# Altium footprint library PCB_Footprints.PcbLib: 303 footprints (part 17 of 19)
Each footprint in its own frame and in the unit in brackets; x right, y up, seen from the top. Pads: shape width x height; smd on the part's side, far side on the other; paste and mask are expansions set on the pad; w line width, h text height; cw(c..) or ccw(c..) is an arc to the next point about the centre after c.
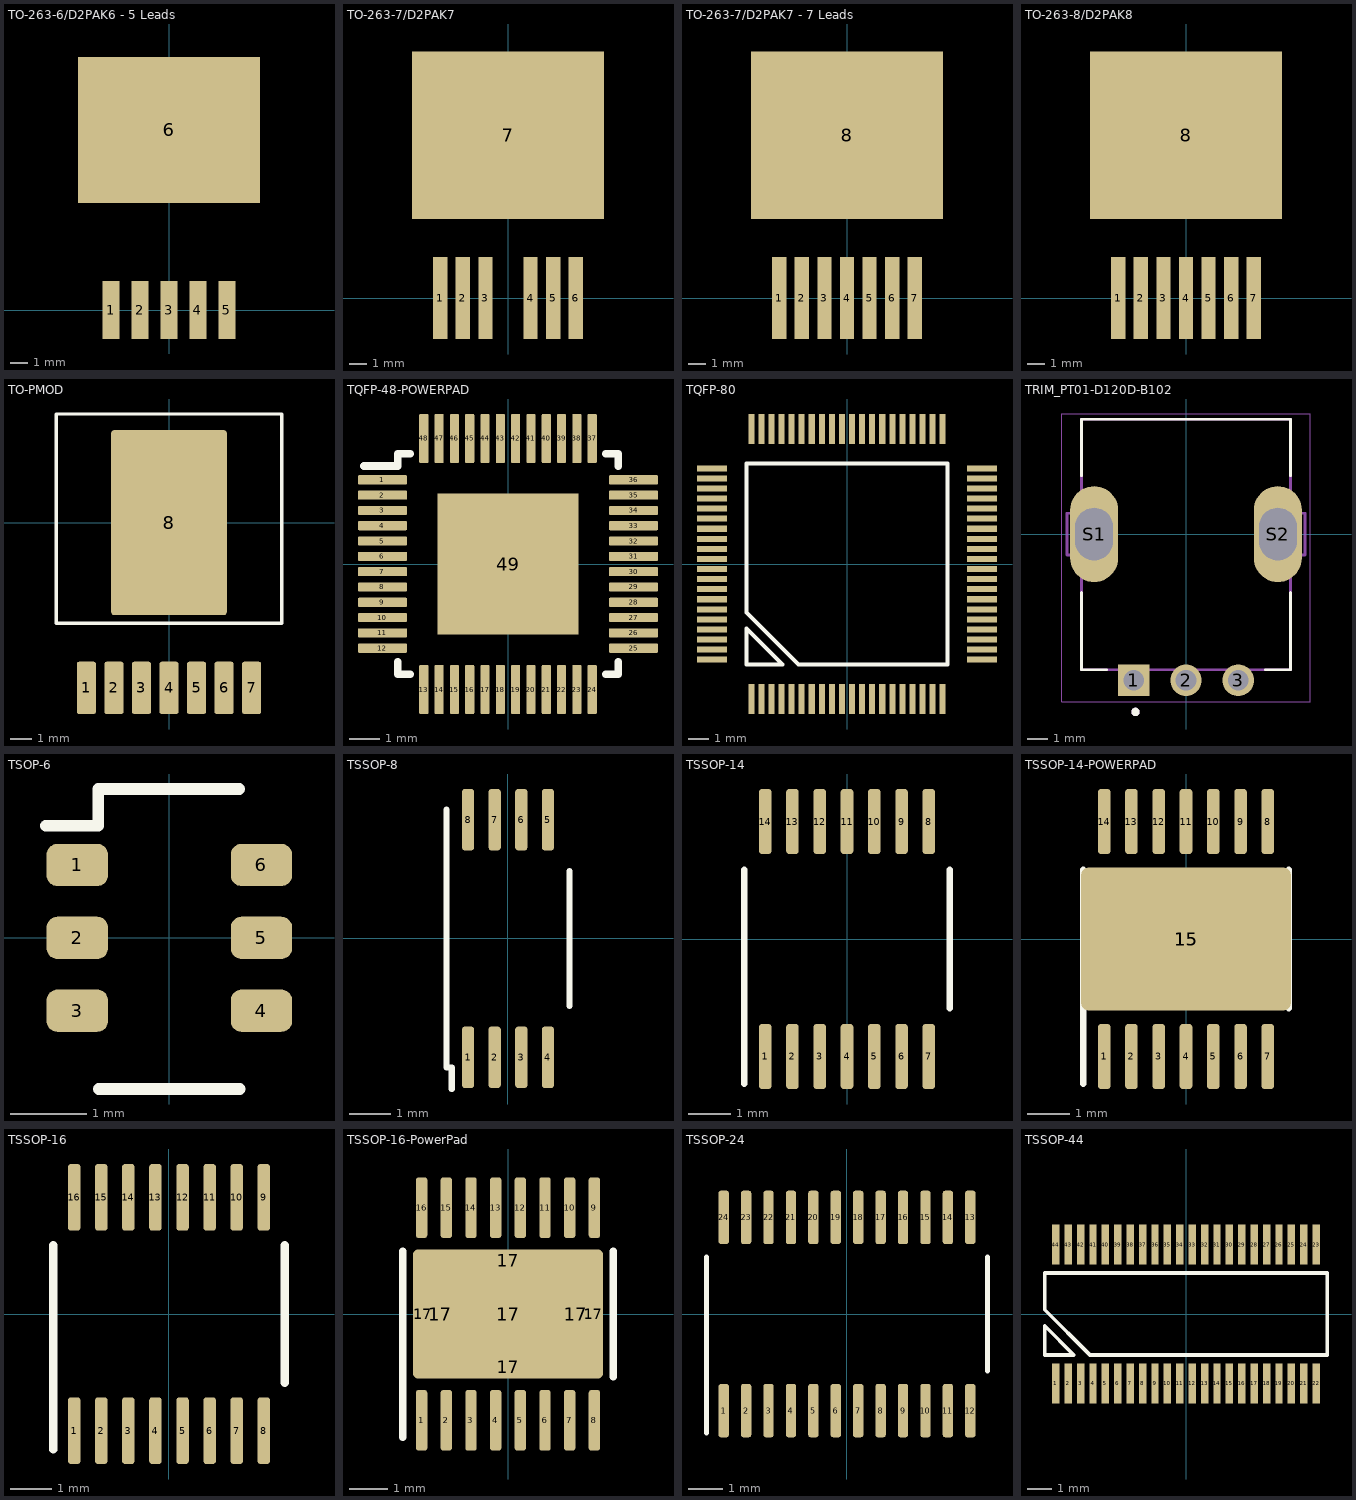
[diagram p16: the footprints below, top view; thin cyan lines are the x and y axes]

## TO-263-6/D2PAK6 - 5 Leads [mm] "TO-263-6, D²Pak (5 Leads + Tab), Modified from TO-263-7. From Texas Instruments  TL2575HV-05QKTTRQ1"
height 4.83
pads (6):
  rect 1x3.4 smd: 1(-3.4,0) 2(-1.7,0) 3(0,0) 4(1.7,0) 5(3.4,0)
  rect 10.7x8.6 smd: 6(0,10.6)
3D body "TL2575HV-05QKTTRQ1.STEP": height 4.65, standoff -0.03, extent -4.34,-1.11 4.3,14.76

## TO-263-7/D2PAK7 [mm] "TO-263-7, D²Pak (6 Leads + Tab), TO-263CB. From Infineon FLG09089"
height 4.83
pads (7):
  rect 0.8x4.6 smd: 1(-3.81,0) 2(-2.54,0) 3(-1.27,0) 4(1.27,0) 5(2.54,0) 6(3.81,0)
  rect 10.8x9.4 smd: 7(0,9.15)
3D body "SW3dPS-TO263-7S.STEP": height 4.8, standoff 0, extent -5,-2.125 5,13.545

## TO-263-7/D2PAK7 - 7 Leads [mm] "TO-263-7, D²Pak (7 Leads + Tab), Modified from TO-263CB. From Infineon FLG09089"
height 4.83
pads (8):
  rect 0.8x4.6 smd: 1(-3.81,0) 2(-2.54,0) 3(-1.27,0) 4(0,0) 5(1.27,0) 6(2.54,0) 7(3.81,0)
  rect 10.8x9.4 smd: 8(0,9.15)
3D body "SW3dPS-TO263-7S.STEP": height 4.8, standoff 0, extent -5,-2.125 5,13.545

## TO-263-8/D2PAK8 [mm] "TO-263-8, D²Pak (7 Leads + Tab), TO-263CA. modified from Infineon FLG09089"
height 4.572
pads (8):
  rect 0.8x4.6 smd: 1(-3.81,0) 2(-2.54,0) 3(-1.27,0) 4(0,0) 5(1.27,0) 6(2.54,0) 7(3.81,0)
  rect 10.8x9.4 smd: 8(0,9.15)
3D body "SW3dPS-TO263-7-1.STEP": height 4.81, standoff 0.01, extent -5,-2.05 5,13.62

## TO-PMOD [mil] "Based on WebBench design download."
pads (8):
  rrect25% 35x95 smd: 1(-150,-300) 2(-100,-300) 3(-50,-300) 4(0,-300) 5(50,-300) 6(100,-300) 7(150,-300)
  rrect5% 210x336 smd: 8(0,0)
Top Overlay:
  lines w6: -204.5,-182.75 -204.5,197.25 204.5,197.25 204.5,-182.75 -204.5,-182.75
3D body "NDW0007A.-TO-PMODstp.stp": height 188.3, standoff 0.5, extent -200.2,-341.93 199.8,200.2

## TQFP-48-POWERPAD [mm] "TQFP, 48-Leads, Body 7.00x7.00mm, Pitch 0.50mm, Thermal Pad 5.2x5.2mm from DRV8343Q1 rev Apr19 / 4146927/B 08/03"
height 1.2
pads (49):
  rrect25% 1.6x0.3 smd: 1(-4.1,2.75) 2(-4.1,2.25) 3(-4.1,1.75) 4(-4.1,1.25) 5(-4.1,0.75) 6(-4.1,0.25) 7(-4.1,-0.25) 8(-4.1,-0.75) 9(-4.1,-1.25) 10(-4.1,-1.75) 11(-4.1,-2.25) 12(-4.1,-2.75) 25(4.1,-2.75) 26(4.1,-2.25) 27(4.1,-1.75) 28(4.1,-1.25) 29(4.1,-0.75) 30(4.1,-0.25) 31(4.1,0.25) 32(4.1,0.75) 33(4.1,1.25) 34(4.1,1.75) 35(4.1,2.25) 36(4.1,2.75)
  rrect25% 0.3x1.6 smd: 13(-2.75,-4.1) 14(-2.25,-4.1) 15(-1.75,-4.1) 16(-1.25,-4.1) 17(-0.75,-4.1) 18(-0.25,-4.1) 19(0.25,-4.1) 20(0.75,-4.1) 21(1.25,-4.1) 22(1.75,-4.1) 23(2.25,-4.1) 24(2.75,-4.1) 37(2.75,4.1) 38(2.25,4.1) 39(1.75,4.1) 40(1.25,4.1) 41(0.75,4.1) 42(0.25,4.1) 43(-0.25,4.1) 44(-0.75,4.1) 45(-1.25,4.1) 46(-1.75,4.1) 47(-2.25,4.1) 48(-2.75,4.1)
  rect 4.6x4.6 smd: 49(0,0)
Top Overlay:
  lines w0.254: -4.7,3.2 -3.6,3.2 -3.6,3.6 -3.2,3.6 ; -3.6,-3.2 -3.6,-3.6 -3.2,-3.6 ; 3.2,-3.6 3.6,-3.6 3.6,-3.2 ; 3.2,3.6 3.6,3.6 3.6,3.2
3D body: height 1.2, standoff 0, extent -3.6,-3.6 3.6,3.6

## TQFP-80 [mm] "Thin Quad Flat Package. From Microchip DS00049AR"
height 1.2
pads (80):
  rect 0.3x1.5 smd: 1(-4.75,-6.7) 2(-4.25,-6.7) 3(-3.75,-6.7) 4(-3.25,-6.7) 5(-2.75,-6.7) 6(-2.25,-6.7) 7(-1.75,-6.7) 8(-1.25,-6.7) 9(-0.75,-6.7) 10(-0.25,-6.7) 11(0.25,-6.7) 12(0.75,-6.7) 13(1.25,-6.7) 14(1.75,-6.7) 15(2.25,-6.7) 16(2.75,-6.7) 17(3.25,-6.7) 18(3.75,-6.7) 19(4.25,-6.7) 20(4.75,-6.7) 41(4.75,6.7) 42(4.25,6.7) 43(3.75,6.7) 44(3.25,6.7) 45(2.75,6.7) 46(2.25,6.7) 47(1.75,6.7) 48(1.25,6.7) 49(0.75,6.7) 50(0.25,6.7) 51(-0.25,6.7) 52(-0.75,6.7) 53(-1.25,6.7) 54(-1.75,6.7) 55(-2.25,6.7) 56(-2.75,6.7) 57(-3.25,6.7) 58(-3.75,6.7) 59(-4.25,6.7) 60(-4.75,6.7)
  rect 1.5x0.3 smd: 21(6.7,-4.75) 22(6.7,-4.25) 23(6.7,-3.75) 24(6.7,-3.25) 25(6.7,-2.75) 26(6.7,-2.25) 27(6.7,-1.75) 28(6.7,-1.25) 29(6.7,-0.75) 30(6.7,-0.25) 31(6.7,0.25) 32(6.7,0.75) 33(6.7,1.25) 34(6.7,1.75) 35(6.7,2.25) 36(6.7,2.75) 37(6.7,3.25) 38(6.7,3.75) 39(6.7,4.25) 40(6.7,4.75) 61(-6.7,4.75) 62(-6.7,4.25) 63(-6.7,3.75) 64(-6.7,3.25) 65(-6.7,2.75) 66(-6.7,2.25) 67(-6.7,1.75) 68(-6.7,1.25) 69(-6.7,0.75) 70(-6.7,0.25) 71(-6.7,-0.25) 72(-6.7,-0.75) 73(-6.7,-1.25) 74(-6.7,-1.75) 75(-6.7,-2.25) 76(-6.7,-2.75) 77(-6.7,-3.25) 78(-6.7,-3.75) 79(-6.7,-4.25) 80(-6.7,-4.75)
Top Overlay:
  lines w0.2: -5,-5 -5,-3.2 -3.2,-5 -5,-5 ; -5,-2.4 -2.4,-5 5,-5 5,5 -5,5 -5,-2.4
3D body "User Library-TQFP-80.STEP": height 1.07, standoff 0.01, extent -7,-7 7,7

## TRIM_PT01-D120D-B102 [mm]
height 26.8
pads (5):
  rect 1.508x1.508 / inner round 1.508 / far side rect 1.508x1.508 hole 1: 1(-2.5,-7)
  round 1.508 hole 1: 2(0,-7) 3(2.5,-7)
  oval 2.3x4.6 hole 1.8 slot 2.5 at 90 deg: S1(-4.4,0) S2(4.4,0)
Top Overlay:
  circle w0.2: c-2.418,-8.514 r0.1
  lines w0.127: -5,-2.8 -5,-6.5 -3.8,-6.5 ; -5,2.8 -5,5.5 5,5.5 5,2.8 ; 3.8,-6.5 5,-6.5 5,-2.8
Mechanical 13:
  circle w0.2: c-2.418,-8.514 r0.1
  lines w0.127: -5.7,-1 -5,-1 -5,-6.5 5,-6.5 5,-1 5.7,-1 5.7,1 5,1 5,5.5 -5,5.5 -5,1 -5.7,1 -5.7,-1
Mechanical 15:
  lines w0.05: -5.95,-8.03 5.95,-8.03 5.95,5.75 -5.95,5.75 -5.95,-8.03
3D body "PT01-D120D-B102.step": height 20.1, standoff -4.65, extent -5.636,-7.175 5.632,5.475

## TSOP-6 [mm] "TSSOP-8, 0.95mm pitch, 2.9mm x1.5mm x1mm body. Modified from Nexperia SOT457, 5 May 2018"
height 1
pads (6):
  rrect50% 0.8x0.55 smd: 1(-1.2,0.95) 2(-1.2,0) 3(-1.2,-0.95) 4(1.2,-0.95) 5(1.2,0) 6(1.2,0.95)
Top Overlay:
  lines w0.15: -1.61,1.46 -0.93,1.46 -0.93,1.94 0.91,1.94 ; -0.92,-1.97 0.92,-1.97
3D body: height 1.1, standoff 0, extent -0.75,-1.95 0.75,1.95

## TSSOP-8 [mm] "TSSOP-8, 0.65mm pitch. Modified from TI PW(R-PDSO-G14) 4211284-2/G 08/15"
height 1.2
pads (8):
  rrect50% 0.3x1.5 smd: 1(-0.975,-2.9) 2(-0.325,-2.9) 3(0.325,-2.9) 4(0.975,-2.9) 5(0.975,2.9) 6(0.325,2.9) 7(-0.325,2.9) 8(-0.975,2.9)
Top Overlay:
  lines w0.15: -1.5,3.15 -1.5,-3.15 -1.375,-3.15 -1.375,-3.675 ; 1.5,-1.65 1.5,1.65
3D body "User Library-TSS0P8.step": height 1.1, standoff 0.01, extent -1.5,-3.13 1.5,3.15

## TSSOP-14 [mm] "TSSOP-14, 0.65mm pitch. From TI PW(R-PDSO-G14) 4211284-2/G 08/15"
height 1.2
pads (14):
  rrect50% 0.3x1.55 smd: 1(-1.95,-2.8) 2(-1.3,-2.8) 3(-0.65,-2.8) 4(0,-2.8) 5(0.65,-2.8) 6(1.3,-2.8) 7(1.95,-2.8) 8(1.95,2.8) 9(1.3,2.8) 10(0.65,2.8) 11(0,2.8) 12(-0.65,2.8) 13(-1.3,2.8) 14(-1.95,2.8)
Top Overlay:
  lines w0.15: -2.45,-3.45 -2.45,1.65 ; 2.45,-1.65 2.45,1.65
3D body "User Library-tssop14-2.step": height 1.2, standoff 0, extent -2.55,-3.2 2.55,3.2

## TSSOP-14-POWERPAD [mm] "TSSOP-14-POWERPAD, 0.65mm pitch. Adapted from TSSOP-14 & TSSOP-16-POWERPAD, Solder mask from ALM2402-Q1"
height 1.2
pads (16):
  rrect50% 0.3x1.55 smd: 1(-1.95,-2.8) 2(-1.3,-2.8) 3(-0.65,-2.8) 4(0,-2.8) 5(0.65,-2.8) 6(1.3,-2.8) 7(1.95,-2.8) 8(1.95,2.8) 9(1.3,2.8) 10(0.65,2.8) 11(0,2.8) 12(-0.65,2.8) 13(-1.3,2.8) 14(-1.95,2.8)
  rrect10% 5x3.4 smd paste-15: 15(0,0)
  rect 2.86x1.82 smd paste+0 mask+0: 15(0,0)
Top Overlay:
  lines w0.15: -2.45,-3.45 -2.45,1.65 ; 2.45,-1.65 2.45,1.65
3D body "User Library-tssop14-2.step": height 1.2, standoff 0, extent -2.55,-3.2 2.55,3.2

## TSSOP-16 [mm] "TSSOP-16, 0.65mm pitch. Pads from TI PWP(R-PDSO-G16) 4207609-4/W 09/15"
height 1.2
pads (16):
  rrect50% 0.3x1.6 smd: 1(-2.275,-2.8) 2(-1.625,-2.8) 3(-0.975,-2.8) 4(-0.325,-2.8) 5(0.325,-2.8) 6(0.975,-2.8) 7(1.625,-2.8) 8(2.275,-2.8) 9(2.275,2.8) 10(1.625,2.8) 11(0.975,2.8) 12(0.325,2.8) 13(-0.325,2.8) 14(-0.975,2.8) 15(-1.625,2.8) 16(-2.275,2.8)
Top Overlay:
  lines w0.2: -2.775,-3.25 -2.775,1.65 ; 2.775,-1.65 2.775,1.65
3D body "TI-PWP0016G.stp": height 1, standoff 0, extent -2.5,-3.21 2.5,3.211

## TSSOP-16-PowerPad [mm] "TSSOP-16, 0.65mm pitch. Pads from TI PWP(R-PDSO-G16) 4207609-4/W 09/15, Thermal Pad from TI 4218975/A 07/2015"
height 1.2
pads (23):
  rrect50% 0.3x1.6 smd: 1(-2.275,-2.8) 2(-1.625,-2.8) 3(-0.975,-2.8) 4(-0.325,-2.8) 5(0.325,-2.8) 6(0.975,-2.8) 7(1.625,-2.8) 8(2.275,-2.8) 9(2.275,2.8) 10(1.625,2.8) 11(0.975,2.8) 12(0.325,2.8) 13(-0.325,2.8) 14(-0.975,2.8) 15(-1.625,2.8) 16(-2.275,2.8)
  rrect50% 0.5x3.4 smd paste-5: 17(-2.25,0) 17(2.25,0)
  rect 1x3.4 smd paste-5: 17(-1.778,0) 17(1.778,0)
  rect 4.5x0.6 smd paste-5: 17(0,-1.399) 17(0,1.399)
  rrect10% 3.1x2.25 smd: 17(0,0)
Top Overlay:
  lines w0.2: -2.775,-3.25 -2.775,1.65 ; 2.775,-1.65 2.775,1.65
3D body "TI-PWP0016G.stp": height 1, standoff 0, extent -2.5,-3.21 2.5,3.211

## TSSOP-24 [mm] "TSSOP-24, 0.65mm pitch. Extrapolated from TI PW(R-PDSO-G14) 4211284-2/G 08/15"
height 1.2
pads (24):
  rrect50% 0.3x1.55 smd: 1(-3.575,-2.8) 2(-2.925,-2.8) 3(-2.275,-2.8) 4(-1.625,-2.8) 5(-0.975,-2.8) 6(-0.325,-2.8) 7(0.325,-2.8) 8(0.975,-2.8) 9(1.625,-2.8) 10(2.275,-2.8) 11(2.925,-2.8) 12(3.575,-2.8) 13(3.575,2.8) 14(2.925,2.8) 15(2.275,2.8) 16(1.625,2.8) 17(0.975,2.8) 18(0.325,2.8) 19(-0.325,2.8) 20(-0.975,2.8) 21(-1.625,2.8) 22(-2.275,2.8) 23(-2.925,2.8) 24(-3.575,2.8)
Top Overlay:
  lines w0.15: -4.075,-3.45 -4.075,1.65 ; 4.075,-1.65 4.075,1.65
3D body "User Library-TSSOP-24.step": height 1.21, standoff 0.01, extent -3.95,-3.275 3.95,3.275

## TSSOP-44 [mm] "TSSOP-44, 0.5mm pitch. From TI BQ20Z80-V102 datasheet"
height 1.2
pads (44):
  rect 0.3x1.6 smd: 1(-5.25,-2.8) 2(-4.75,-2.8) 3(-4.25,-2.8) 4(-3.75,-2.8) 5(-3.25,-2.8) 6(-2.75,-2.8) 7(-2.25,-2.8) 8(-1.75,-2.8) 9(-1.25,-2.8) 10(-0.75,-2.8) 11(-0.25,-2.8) 12(0.25,-2.8) 13(0.75,-2.8) 14(1.25,-2.8) 15(1.75,-2.8) 16(2.25,-2.8) 17(2.75,-2.8) 18(3.25,-2.8) 19(3.75,-2.8) 20(4.25,-2.8) 21(4.75,-2.8) 22(5.25,-2.8) 23(5.25,2.8) 24(4.75,2.8) 25(4.25,2.8) 26(3.75,2.8) 27(3.25,2.8) 28(2.75,2.8) 29(2.25,2.8) 30(1.75,2.8) 31(1.25,2.8) 32(0.75,2.8) 33(0.25,2.8) 34(-0.25,2.8) 35(-0.75,2.8) 36(-1.25,2.8) 37(-1.75,2.8) 38(-2.25,2.8) 39(-2.75,2.8) 40(-3.25,2.8) 41(-3.75,2.8) 42(-4.25,2.8) 43(-4.75,2.8) 44(-5.25,2.8)
Top Overlay:
  lines w0.15: -5.7,-1.65 -5.7,-0.475 -4.525,-1.65 -5.7,-1.65 ; -5.7,0.175 -3.875,-1.65 5.7,-1.65 5.7,1.65 -5.7,1.65 -5.7,0.175
3D body "TSSOP50P640X120-44N.step": height 1.2, standoff 0, extent -5.7,-3.2 5.7,3.2